# Altium footprint library DrPCB.PcbLib: 910 footprints (part 43 of 57)
Each footprint in its own frame and in the unit in brackets; x right, y up, seen from the top. Pads: shape width x height; smd on the part's side, far side on the other; paste and mask are expansions set on the pad; w line width, h text height; cw(c..) or ccw(c..) is an arc to the next point about the centre after c.
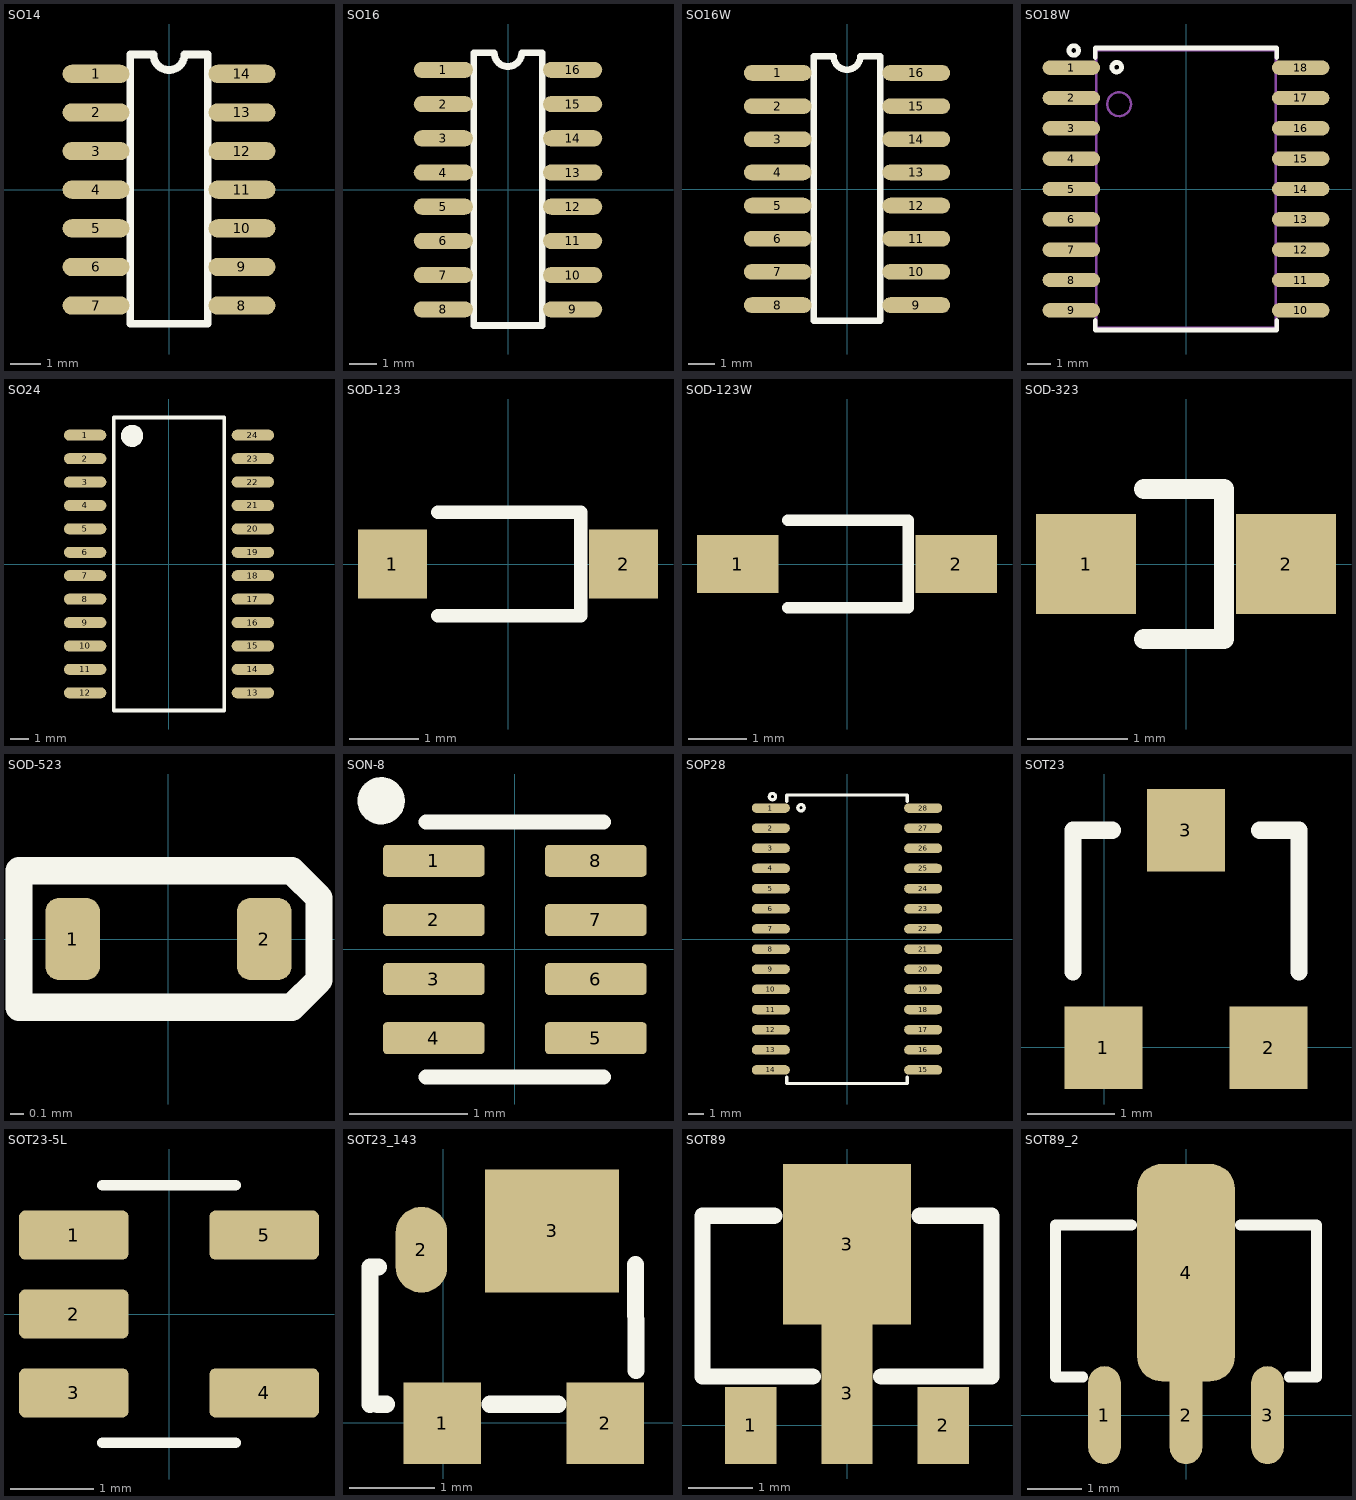
[diagram p42: the footprints below, top view; thin cyan lines are the x and y axes]

## SO14 [mm]
pads (14):
  oval 2.2x0.6 smd: 1(-2.4,3.81) 2(-2.4,2.54) 3(-2.4,1.27) 4(-2.4,0) 5(-2.4,-1.27) 6(-2.4,-2.54) 7(-2.4,-3.81) 8(2.4,-3.81) 9(2.4,-2.54) 10(2.4,-1.27) 11(2.4,0) 12(2.4,1.27) 13(2.4,2.54) 14(2.4,3.81)
Top Overlay:
  lines w0.254: -1.27,-0.595 -1.27,4.445 -0.508,4.445 ; -1.27,0.635 -1.27,-4.405 1.27,-4.405 1.27,0.635 ; -0.513,4.445 ccw(c-0.002,4.445) 0.508,4.445 1.27,4.445 1.27,-0.595
3D body "soic-14.stp": height 1.57, standoff -0.03, extent -3.023,-4.318 3.023,4.318

## SO16 [mm]
pads (16):
  oval 2.2x0.6 smd: 1(-2.4,4.445) 2(-2.4,3.175) 3(-2.4,1.905) 4(-2.4,0.635) 5(-2.4,-0.635) 6(-2.4,-1.905) 7(-2.4,-3.175) 8(-2.4,-4.445) 9(2.4,-4.445) 10(2.4,-3.175) 11(2.4,-1.905) 12(2.4,-0.635) 13(2.4,0.635) 14(2.4,1.905) 15(2.4,3.175) 16(2.4,4.445)
Top Overlay:
  lines w0.254: -1.27,-5.04 1.27,-5.04 ; -1.27,-5.016 -1.27,1.27 ; -1.27,0.04 -1.27,5.08 -0.508,5.08 ; -0.513,5.08 ccw(c-0.002,5.08) 0.508,5.08 1.27,5.08 1.27,0.04 ; 1.27,-5.042 1.27,1.27
3D body "User Library-SOIC-16-2.step": height 1.75, standoff 0, extent -3,-5 3,5

## SO16W [mm]
pads (16):
  oval 2.6x0.6 smd: 1(-2.654,4.445) 2(-2.654,3.175) 3(-2.654,1.905) 4(-2.654,0.635) 5(-2.654,-0.635) 6(-2.654,-1.905) 7(-2.654,-3.175) 8(-2.654,-4.445) 9(2.654,-4.445) 10(2.654,-3.175) 11(2.654,-1.905) 12(2.654,-0.635) 13(2.654,0.635) 14(2.654,1.905) 15(2.654,3.175) 16(2.654,4.445)
Top Overlay:
  lines w0.254: -1.27,-5.04 1.27,-5.04 ; -1.27,-5.016 -1.27,1.27 ; -1.27,0.04 -1.27,5.08 -0.508,5.08 ; -0.513,5.08 ccw(c-0.002,5.08) 0.508,5.08 1.27,5.08 1.27,0.04 ; 1.27,-5.042 1.27,1.27
3D body "User Library-SOIC-16-2.step": height 1.75, standoff 0, extent -3,-5 3,5

## SO18W [mm] "SOP, SOIC, 7.5mm width, 1.27mm pitch,"
pads (18):
  oval 2.4x0.6 smd: 1(-4.8,5.08) 2(-4.8,3.81) 3(-4.8,2.54) 4(-4.8,1.27) 5(-4.8,0) 6(-4.8,-1.27) 7(-4.8,-2.54) 8(-4.8,-3.81) 9(-4.8,-5.08) 10(4.8,-5.08) 11(4.8,-3.81) 12(4.8,-2.54) 13(4.8,-1.27) 14(4.8,0) 15(4.8,1.27) 16(4.8,2.54) 17(4.8,3.81) 18(4.8,5.08)
Top Overlay:
  circle w0.2: c-2.9,5.1 r0.2
  circle w0.2: c-4.7,5.8 r0.2
  lines w0.2: -3.8,-5.5 -3.8,-5.9 3.8,-5.9 3.8,-5.5 ; -3.8,5.5 -3.8,5.9 3.8,5.9 3.8,5.5
Mechanical 13:
  circle w0.1: c-2.8,3.55 r0.5
  lines w0.1: -3.75,-5.8 3.75,-5.8 3.75,5.8 -3.75,5.8 -3.75,-5.8
3D body "User Library-SOIC18-300.step": height 2.65, standoff 0, extent -5.15,-5.765 5.15,5.765

## SO24 [mm]
pads (24):
  oval 2.3x0.6 smd: 1(-4.55,6.985) 2(-4.55,5.715) 3(-4.55,4.445) 4(-4.55,3.175) 5(-4.55,1.905) 6(-4.55,0.635) 7(-4.55,-0.635) 8(-4.55,-1.905) 9(-4.55,-3.175) 10(-4.55,-4.445) 11(-4.55,-5.715) 12(-4.55,-6.985) 13(4.55,-6.985) 14(4.55,-5.715) 15(4.55,-4.445) 16(4.55,-3.175) 17(4.55,-1.905) 18(4.55,-0.635) 19(4.55,0.635) 20(4.55,1.905) 21(4.55,3.175) 22(4.55,4.445) 23(4.55,5.715) 24(4.55,6.985)
Top Overlay:
  circle w0.6: c-2,6.95 r0.3
  lines w0.2: -3,-7.95 -3,7.95 3,7.95 3,-7.95 -3,-7.95

## SOD-123 [mm]
pads (2):
  rect 1x1 smd: 1(-1.675,0) 2(1.675,0)
Top Overlay:
  lines w0.2: -1.016,-0.75 1.054,-0.75 1.054,0.75 -1.016,0.75
3D body "CircuitWorks-SOD123.step": height 1.27, standoff 0, extent -1.85,-0.8 1.85,0.8

## SOD-123W [mm]
pads (2):
  rect 1.4x1 smd: 1(-1.875,0) 2(1.875,0)
Top Overlay:
  lines w0.2: -1.016,-0.75 1.054,-0.75 1.054,0.75 -1.016,0.75
3D body "CircuitWorks-SOD123.step": height 1.27, standoff 0, extent -1.85,-0.8 1.85,0.8

## SOD-323 [mm] "DIODE0805, SOD-323, SC-76, DL-35, 0805 similar size"
height 1.4
pads (2):
  rect 1x1 smd: 1(-1,0) 2(1,0)
Top Overlay:
  lines w0.2: -0.419,-0.75 0.381,-0.75 0.381,0.75 -0.419,0.75
Top Paste:
  region: -0.9,0.5 -0.82,0.5 -0.673,0.439 -0.561,0.327 -0.5,0.18 -0.5,0.1 -0.5,-0.1 -0.5,-0.18 -0.561,-0.327 -0.673,-0.439 -0.82,-0.5 -0.9,-0.5 -1.15,-0.5 -1.18,-0.5 -1.235,-0.477 -1.277,-0.435 -1.3,-0.38 -1.3,-0.35 -1.3,0.35 -1.3,0.38 -1.277,0.435 -1.235,0.477 -1.18,0.5 -1.15,0.5
  region: 0.9,0.5 0.82,0.5 0.673,0.439 0.561,0.327 0.5,0.18 0.5,0.1 0.5,-0.1 0.5,-0.18 0.561,-0.327 0.673,-0.439 0.82,-0.5 0.9,-0.5 1.15,-0.5 1.18,-0.5 1.235,-0.477 1.277,-0.435 1.3,-0.38 1.3,-0.35 1.3,0.35 1.3,0.38 1.277,0.435 1.235,0.477 1.18,0.5 1.15,0.5
3D body "SOD323F.STEP": height 1, standoff 0, extent -1.25,-0.675 1.25,0.675

## SOD-523 [mm]
pads (2):
  rrect50% 0.4x0.6 smd paste-0.05 mask+0.075: 1(-0.7,0) 2(0.7,0)
Top Overlay:
  lines w0.2: -1.092,-0.5 -1.092,0.5 0.9,0.5 1.1,0.3 1.1,-0.3 0.9,-0.5 -1.092,-0.5
3D body "User Library-SOD-523F.step": height 0.7, standoff 0, extent -0.8,-0.399 0.8,0.399

## SON-8 [mm]
pads (8):
  rrect25% 0.86x0.27 smd paste-0.03: 1(-0.685,0.75) 2(-0.685,0.25) 3(-0.685,-0.25) 4(-0.685,-0.75) 5(0.685,-0.75) 6(0.685,-0.25) 7(0.685,0.25) 8(0.685,0.75)
Top Overlay:
  circle w0.2: c-1.13,1.257 r0.1
  lines w0.127: -0.751,-1.079 0.749,-1.079 ; -0.751,1.079 0.749,1.079
3D body "TPS62840DLCR--3DModel-STEP-56544.STEP": height 1.01, standoff 0.01, extent -0.75,-1 0.75,1

## SOP28 [mm] "SOP, SOIC, 7.5mm width, 1.27mm pitch,"
pads (28):
  oval 2.4x0.6 smd: 1(-4.8,8.255) 2(-4.8,6.985) 3(-4.8,5.715) 4(-4.8,4.445) 5(-4.8,3.175) 6(-4.8,1.905) 7(-4.8,0.635) 8(-4.8,-0.635) 9(-4.8,-1.905) 10(-4.8,-3.175) 11(-4.8,-4.445) 12(-4.8,-5.715) 13(-4.8,-6.985) 14(-4.8,-8.255) 15(4.8,-8.255) 16(4.8,-6.985) 17(4.8,-5.715) 18(4.8,-4.445) 19(4.8,-3.175) 20(4.8,-1.905) 21(4.8,-0.635) 22(4.8,0.635) 23(4.8,1.905) 24(4.8,3.175) 25(4.8,4.445) 26(4.8,5.715) 27(4.8,6.985) 28(4.8,8.255)
Top Overlay:
  circle w0.2: c-4.7,8.975 r0.2
  circle w0.2: c-2.9,8.275 r0.2
  lines w0.2: -3.8,-8.713 -3.8,-9.113 3.8,-9.113 3.8,-8.713 ; -3.8,8.675 -3.8,9.075 3.8,9.075 3.8,8.675
3D body "SO_28_WW.step": height 2.65, standoff 0, extent -5.15,-9 5.15,9

## SOT23 [mm]
pads (3):
  rect 0.9x0.95 smd: 1(-0.01,-0.005) 2(1.89,-0.005) 3(0.94,2.495)
Top Overlay:
  lines w0.2: -0.36,0.87 -0.36,2.495 0.09,2.495 ; 1.79,2.495 2.24,2.495 2.24,0.87
3D body "CircuitWorks-SOT-23.step": height 1.11, standoff 0.01, extent -0.56,-0.005 2.44,2.495

## SOT23-5L [mm]
pads (5):
  rrect25% 1.32x0.59 smd paste-0.1: 1(-1.145,0.95) 2(-1.145,0) 3(-1.145,-0.95) 4(1.145,-0.95) 5(1.145,0.95)
Top Overlay:
  lines w0.127: -0.8,-1.549 0.8,-1.549 ; -0.8,1.549 0.8,1.549
3D body "ld3985m33r.stp": height 1.19, standoff 0, extent -1.4,-1.475 1.4,1.475

## SOT23_143 [mm]
pads (4):
  rect 0.9x0.95 smd: 1(-0.01,-0.005) 2(1.89,-0.005)
  oval 0.6x1 smd paste-0.05: 2(-0.252,2.016)
  rect 1.56x1.43 smd: 3(1.27,2.235)
Top Overlay:
  lines w0.2: -0.851,0.216 -0.851,1.816 -0.751,1.816 ; -0.763,0.216 -0.663,0.216 ; 0.546,0.216 1.337,0.216 ; 2.243,1.841 2.248,0.61
3D body "CircuitWorks-SOT-23.step": height 1.11, standoff 0.01, extent -0.56,-0.005 2.44,2.495

## SOT89 [mm]
pads (4):
  rect 0.8x1.2 smd: 1(-1.5,0) 2(1.5,0)
  rect 0.8x2.2 smd: 3(0,0.5)
  rect 2x2.5 smd: 3(0,2.819)
Top Overlay:
  lines w0.254: -1.132,3.262 -2.248,3.262 -2.248,0.762 -0.533,0.762 ; 0.533,0.762 2.248,0.762 2.248,3.262 1.132,3.262

## SOT89_2 [mm] "SOT89, SOT-89, SBF-4089, SOT89A, GALI, SC-62, DF782, TO-243AA(JEDEC), 1.5mm pitch"
pads (4):
  oval 0.6x1.8 smd: 1(-1.5,0) 2(0,0) 3(1.5,0)
  rrect50% 1.8x4 smd paste-5: 4(0,2.621)
Top Overlay:
  lines w0.2: -1.9,0.7 -2.4,0.7 -2.4,3.5 -1,3.5 ; 1,3.5 2.4,3.5 2.4,0.7 1.9,0.7
Top Paste:
  rectangle: -0.7,1.2 0.7,2.6
  rectangle: -0.7,3 0.7,4.4
3D body "SW3dPS-SOT89.STEP": height 1.59, standoff -0.02, extent -2.3,-0.1 2.3,4.15